# Altium footprint library DrPCB.PcbLib: 910 footprints (part 4 of 57)
Each footprint in its own frame and in the unit in brackets; x right, y up, seen from the top. Pads: shape width x height; smd on the part's side, far side on the other; paste and mask are expansions set on the pad; w line width, h text height; cw(c..) or ccw(c..) is an arc to the next point about the centre after c.
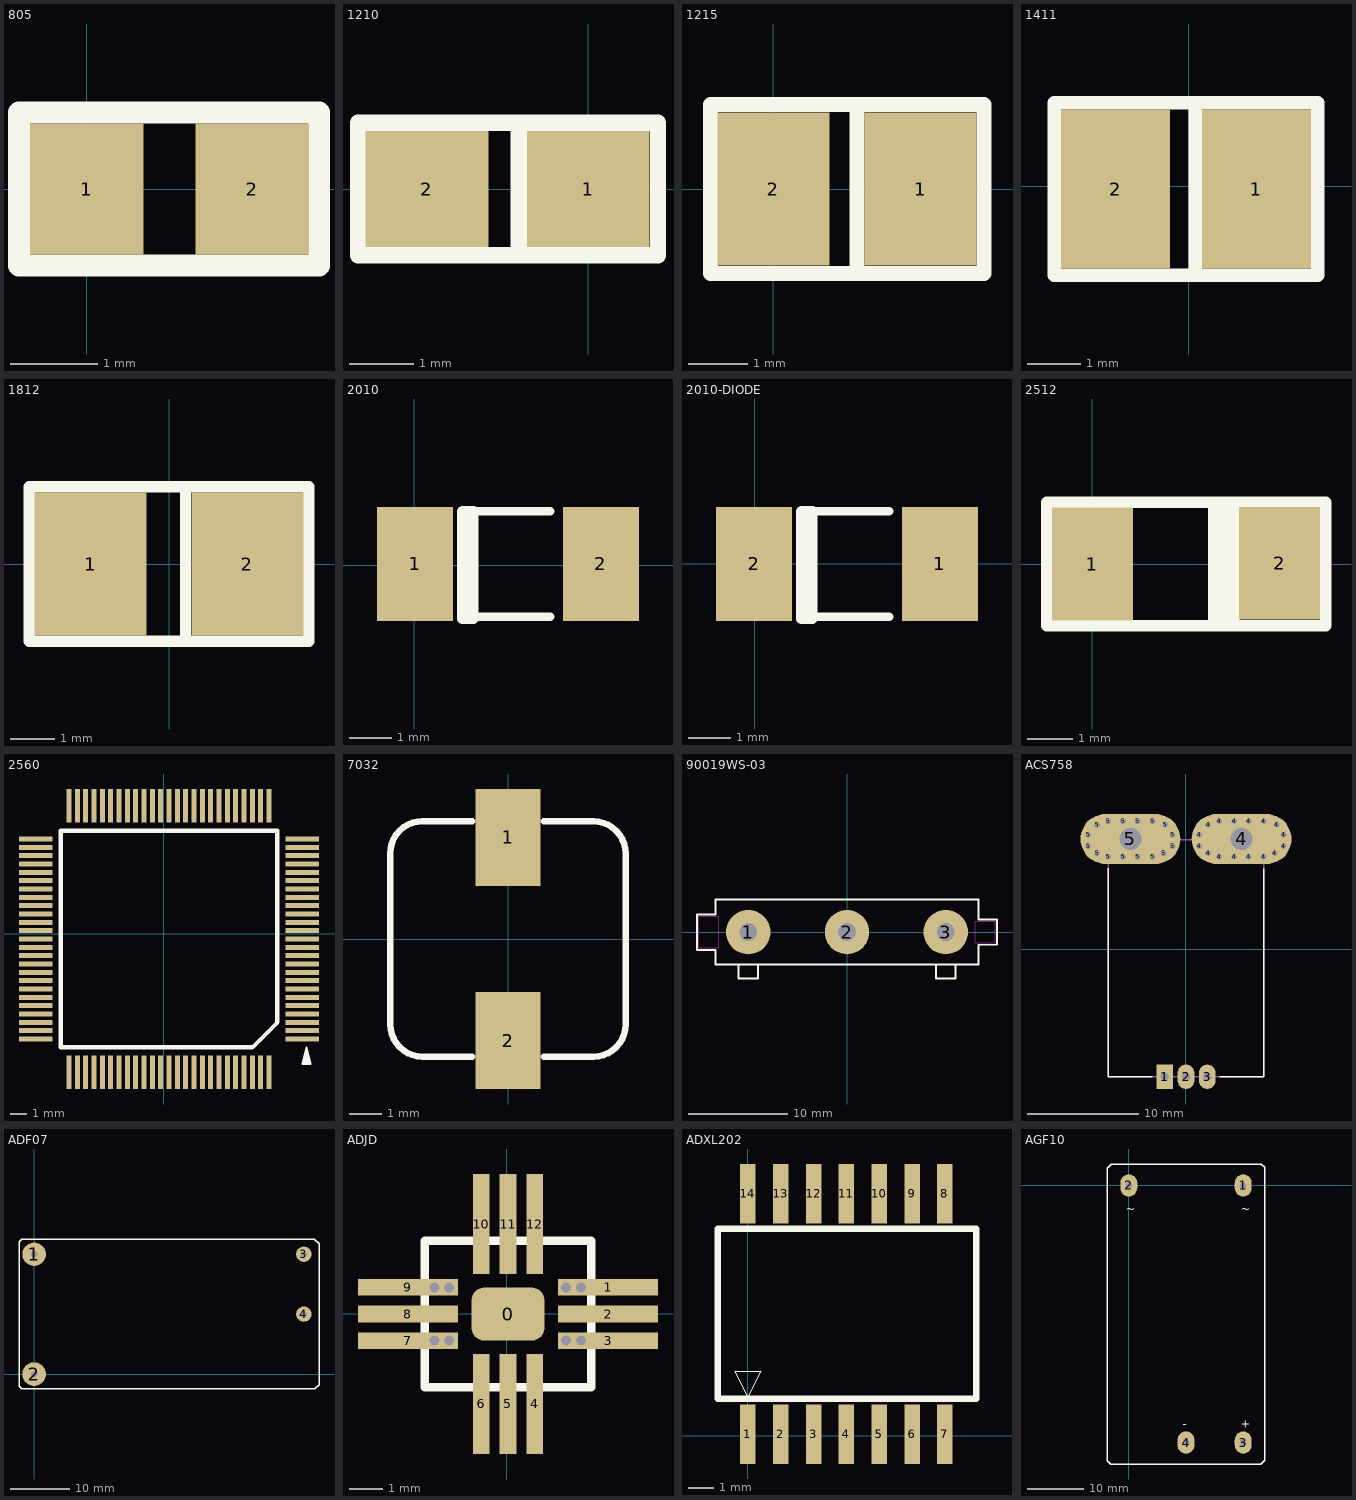
[diagram p3: the footprints below, top view; thin cyan lines are the x and y axes]

## 805 [mm]
pads (2):
  rect 1.3x1.5 smd: 1(0.003,0) 2(1.903,0)
Top Overlay:
  lines w0.254: -0.775,-0.876 -0.775,0.876 2.667,0.876 2.667,-0.876 -0.775,-0.876

## 1210 [mm]
pads (2):
  rect 1.9x1.8 smd: 1(0,0) 2(-2.5,0)
Top Overlay:
  lines w0.254: -1.079,-1.029 -1.079,0.978 ; -3.569,-1.029 -3.569,1.029 1.079,1.029 1.079,-1.029 -3.569,-1.029

## 1215 [mm]
pads (2):
  rect 1.9x2.6 smd: 1(2.502,0) 2(0.002,0)
Top Overlay:
  lines w0.254: 1.422,-1.372 1.422,1.397 ; -1.067,-1.435 3.581,-1.435 3.581,1.435 -1.067,1.435 -1.067,-1.435

## 1411 [mm]
pads (2):
  rect 2.05x3 smd: 1(1.269,-0.051) 2(-1.381,-0.051)
Top Overlay:
  lines w0.254: 0.114,-1.613 0.114,1.562 ; -2.54,-1.676 2.426,-1.676 2.426,1.575 -2.54,1.575 -2.54,-1.676

## 1812 [mm]
pads (2):
  rect 2.5x3.2 smd: 1(-1.75,0) 2(1.75,0)
Top Overlay:
  lines w0.254: 0.368,-1.702 0.368,1.689 ; -3.124,-1.727 -3.124,1.727 3.124,1.727 3.124,-1.727 -3.124,-1.727

## 2010 [mm]
pads (2):
  rect 1.8x2.7 smd: 1(0.023,0.025) 2(4.423,0.025)
Top Overlay:
  lines w0.2: 1.223,-1.225 3.223,-1.225 ; 1.223,1.275 3.223,1.275
  lines w0.254: 1.143,-1.27 1.397,-1.27 1.397,1.27 1.143,1.27 1.143,-1.27

## 2010-DIODE [mm]
pads (2):
  rect 1.8x2.7 smd: 1(4.384,0) 2(-0.016,0)
Top Overlay:
  lines w0.2: 1.184,-1.25 3.184,-1.25 ; 1.184,1.25 3.184,1.25
  lines w0.254: 1.105,-1.295 1.105,1.245 1.359,1.245 1.359,-1.295 1.105,-1.295

## 2512 [mm]
pads (2):
  rect 1.8x2.5 smd: 1(0,0) 2(4.163,0.013)
Top Overlay:
  lines w0.254: 2.692,-1.372 2.692,1.372 ; 2.896,-1.372 2.896,1.372 ; 3.15,-1.372 3.15,1.372 ; -1.016,-1.372 -1.016,1.372 5.182,1.372 5.182,-1.372 -1.016,-1.372

## 2560 [mm]
pads (100):
  rect 2x0.3 smd: 1(8.308,-6.306) 2(8.308,-5.806) 3(8.308,-5.306) 4(8.308,-4.806) 5(8.308,-4.306) 6(8.308,-3.806) 7(8.308,-3.306) 8(8.308,-2.806) 9(8.308,-2.306) 10(8.308,-1.806) 11(8.308,-1.306) 12(8.308,-0.806) 13(8.308,-0.306) 14(8.308,0.194) 15(8.308,0.694) 16(8.308,1.194) 17(8.308,1.694) 18(8.308,2.194) 19(8.308,2.694) 20(8.308,3.194) 21(8.308,3.694) 22(8.308,4.194) 23(8.308,4.694) 24(8.308,5.194) 25(8.308,5.694) 51(-7.692,5.694) 52(-7.692,5.194) 53(-7.692,4.694) 54(-7.692,4.194) 55(-7.692,3.694) 56(-7.692,3.194) 57(-7.692,2.694) 58(-7.692,2.194) 59(-7.692,1.694) 60(-7.692,1.194) 61(-7.692,0.694) 62(-7.692,0.194) 63(-7.692,-0.306) 64(-7.692,-0.806) 65(-7.692,-1.306) 66(-7.692,-1.806) 67(-7.692,-2.306) 68(-7.692,-2.806) 69(-7.692,-3.306) 70(-7.692,-3.806) 71(-7.692,-4.306) 72(-7.692,-4.806) 73(-7.692,-5.306) 74(-7.692,-5.806) 75(-7.692,-6.306)
  rect 0.3x2 smd: 26(6.308,7.694) 27(5.808,7.694) 28(5.308,7.694) 29(4.808,7.694) 30(4.308,7.694) 31(3.808,7.694) 32(3.308,7.694) 33(2.808,7.694) 34(2.308,7.694) 35(1.808,7.694) 36(1.308,7.694) 37(0.808,7.694) 38(0.308,7.694) 39(-0.192,7.694) 40(-0.692,7.694) 41(-1.192,7.694) 42(-1.692,7.694) 43(-2.192,7.694) 44(-2.692,7.694) 45(-3.192,7.694) 46(-3.692,7.694) 47(-4.192,7.694) 48(-4.692,7.694) 49(-5.192,7.694) 50(-5.692,7.694) 76(-5.692,-8.306) 77(-5.192,-8.306) 78(-4.692,-8.306) 79(-4.192,-8.306) 80(-3.692,-8.306) 81(-3.192,-8.306) 82(-2.692,-8.306) 83(-2.192,-8.306) 84(-1.692,-8.306) 85(-1.192,-8.306) 86(-0.692,-8.306) 87(-0.192,-8.306) 88(0.308,-8.306) 89(0.808,-8.306) 90(1.308,-8.306) 91(1.808,-8.306) 92(2.308,-8.306) 93(2.808,-8.306) 94(3.308,-8.306) 95(3.808,-8.306) 96(4.308,-8.306) 97(4.808,-8.306) 98(5.308,-8.306) 99(5.808,-8.306) 100(6.308,-8.306)
Top Overlay:
  region: 8.808,-7.806 8.558,-6.806 8.308,-7.806
  lines w0.1: 8.308,-7.806 8.558,-6.806 8.808,-7.806 8.308,-7.806
  lines w0.254: -6.192,-6.806 5.308,-6.806 6.808,-5.306 6.808,6.194 -6.192,6.194 -6.192,-6.806

## 7032 [mm]
pads (2):
  rect 2x3 smd: 1(0,3.15) 2(0,-3.15)
Top Overlay:
  lines w0.2: -3.65,-2.624 -3.65,2.658 cw(c-2.658,2.658) -2.658,3.65 -1.11,3.65 ; -3.646,-2.653 ccw(c-2.654,-2.653) -2.654,-3.645 -1.106,-3.645 ; 1.105,-3.646 2.653,-3.646 ccw(c2.653,-2.654) 3.645,-2.654 ; 1.106,3.645 2.654,3.645 cw(c2.654,2.653) 3.646,2.653 ; 3.65,-2.598 3.65,2.649

## 90019WS-03 [mm]
pads (3):
  round 4.5 hole 1.8: 1(-10,0) 2(0,0) 3(10,0)
Top Overlay:
  lines w0.2: -11,-3.3 -11,-4.7 -9,-4.7 -9,-3.3 ; 9,-3.3 9,-4.7 11,-4.7 11,-3.3 ; -15.189,-1.791 -13.3,-1.791 -13.3,-3.3 13.3,-3.3 13.3,-1.283 15.189,-1.283 15.189,1.283 13.3,1.283 13.3,3.3 -13.3,3.3 -13.3,1.791 -15.189,1.791 -15.189,-1.791
Keep-Out Layer:
  lines w0.1: -15,-1.6 -15,1.6 -13,1.6 -13,-1.6 -15,-1.6 ; 13,-1.1 13,1.1 15,1.1 15,-1.1 13,-1.1
3D body: height 14.7, standoff 0, extent -3.296,-3.302 3.296,3.302
3D body: height 14.7, standoff 0, extent -13.303,-4.686 -6.712,3.315
3D body: height 14.7, standoff 0, extent 6.706,-4.686 13.297,3.315
3D body: height 7.6, standoff 0, extent -13.297,-3.296 13.297,3.296

## ACS758 [mm]
pads (37):
  rect 1.5x2.2 hole 0.8: 1(-1.91,-11.5)
  oval 1.5x2.2 hole 0.8: 2(0,-11.5) 3(1.91,-11.5)
  round 0.8 hole 0.5: 4(1.2,9.25) 4(1.2,10.3) 4(2,8.63) 4(2,11.2) 4(3,8.3) 4(3,11.5) 4(4.33,8.3) 4(4.33,11.5) 4(5.66,8.3) 4(5.66,11.5) 4(6.99,8.3) 4(6.99,11.5) 4(8,8.63) 4(8.15,11.2) 4(8.8,9.25) 4(8.8,10.3) 5(-8.8,9.25) 5(-8.8,10.3) 5(-8,8.63) 5(-8,11.2) 5(-7,8.3) 5(-7,11.5) 5(-5.67,8.3) 5(-5.67,11.5) 5(-4.34,8.3) 5(-4.34,11.5) 5(-3.01,8.3) 5(-3.01,11.5) 5(-2,8.63) 5(-1.85,11.2) 5(-1.2,9.25) 5(-1.2,10.3)
  oval 9x4.5 hole 2: 4(5,9.9) 5(-5,9.9)
Top Overlay:
  lines w0.127: -7,7.26 -7,-11.5 -3.06,-11.5 ; 3.06,-11.5 7,-11.5 7,7.24
Mechanical 13:
  lines w0.127: -7,-11.5 -7,9.841 7,9.841 7,-11.5 -7,-11.5
3D body "User Library-ACS754SCB-200-PFF.step": height 7.01, standoff -3.5, extent -7,-12.001 7,10.82

## ADF07 [mm]
pads (4):
  round 4 hole 1.1: 1(-0.001,20.341) 2(-0.001,0.021)
  round 2.6 hole 1.1: 3(45.719,20.341) 4(45.719,10.181)
Top Overlay:
  lines w0.254: -2.562,-2.012 -2.562,22.438 -2.1,22.9 47.524,22.9 48.288,22.136 48.288,-1.793 47.588,-2.493 -2.08,-2.493 -2.562,-2.012

## ADJD [mm]
pads (13):
  rrect50% 2.2x1.6 smd: 0(0.033,-0.012)
  rect 3x0.5 smd: 1(3.032,0.788) 2(3.032,-0.012) 3(3.032,-0.812) 7(-2.968,-0.812) 8(-2.968,-0.012) 9(-2.968,0.788)
  rect 0.5x3 smd: 4(0.832,-2.71) 5(0.032,-2.71) 6(-0.768,-2.71) 10(-0.767,2.69) 11(0.033,2.69) 12(0.833,2.69)
via 1.773,-0.812 diameter 0.4 hole 0.3
via 2.217,0.788 diameter 0.4 hole 0.3
via 1.773,0.788 diameter 0.4 hole 0.3
via -1.733,0.788 diameter 0.4 hole 0.3
via 2.217,-0.812 diameter 0.4 hole 0.3
via -2.177,0.788 diameter 0.4 hole 0.3
via -2.177,-0.812 diameter 0.4 hole 0.3
via -1.733,-0.812 diameter 0.4 hole 0.3
Top Overlay:
  lines w0.254: -2.465,-2.209 2.535,-2.209 2.535,2.191 -2.465,2.191 -2.465,-2.209

## ADXL202 [mm]
pads (14):
  rect 0.599x2.3 smd: 1(-0.003,0.059) 2(1.267,0.059) 3(2.537,0.059) 4(3.807,0.059) 5(5.077,0.059) 6(6.347,0.059) 7(7.617,0.059) 8(7.617,9.355) 9(6.347,9.355) 10(5.077,9.355) 11(3.807,9.355) 12(2.537,9.355) 13(1.267,9.355) 14(-0.003,9.355)
Top Overlay:
  lines w0.025: -0.511,2.484 0.505,2.484 -0.003,1.468 -0.511,2.484
  lines w0.254: -1.174,1.435 -1.174,8.002 8.833,8.002 8.833,1.424 ; -1.173,1.424 8.827,1.424

## AGF10 [mm]
pads (4):
  oval 3x4 hole 1.254: 1(20.371,0) 2(0.051,0) 3(20.371,-45.72) 4(10.211,-45.72)
Top Overlay:
  lines w0.254: -3.759,-48.946 -3.759,3.099 -3.048,3.81 23.622,3.81 24.181,3.251 24.181,-48.844 23.495,-49.53 -3.175,-49.53 -3.759,-48.946
  text "+" at 19.939,-43.053 h1.52
  text "-" at 9.652,-43.053 h1.52
  text "~" at 19.939,-4.826 h1.52
  text "~" at -0.508,-4.826 h1.52